# Altium footprint library North POLE.PcbLib: 419 footprints (part 23 of 27)
Each footprint in its own frame and in the unit in brackets; x right, y up, seen from the top. Pads: shape width x height; smd on the part's side, far side on the other; paste and mask are expansions set on the pad; w line width, h text height; cw(c..) or ccw(c..) is an arc to the next point about the centre after c.
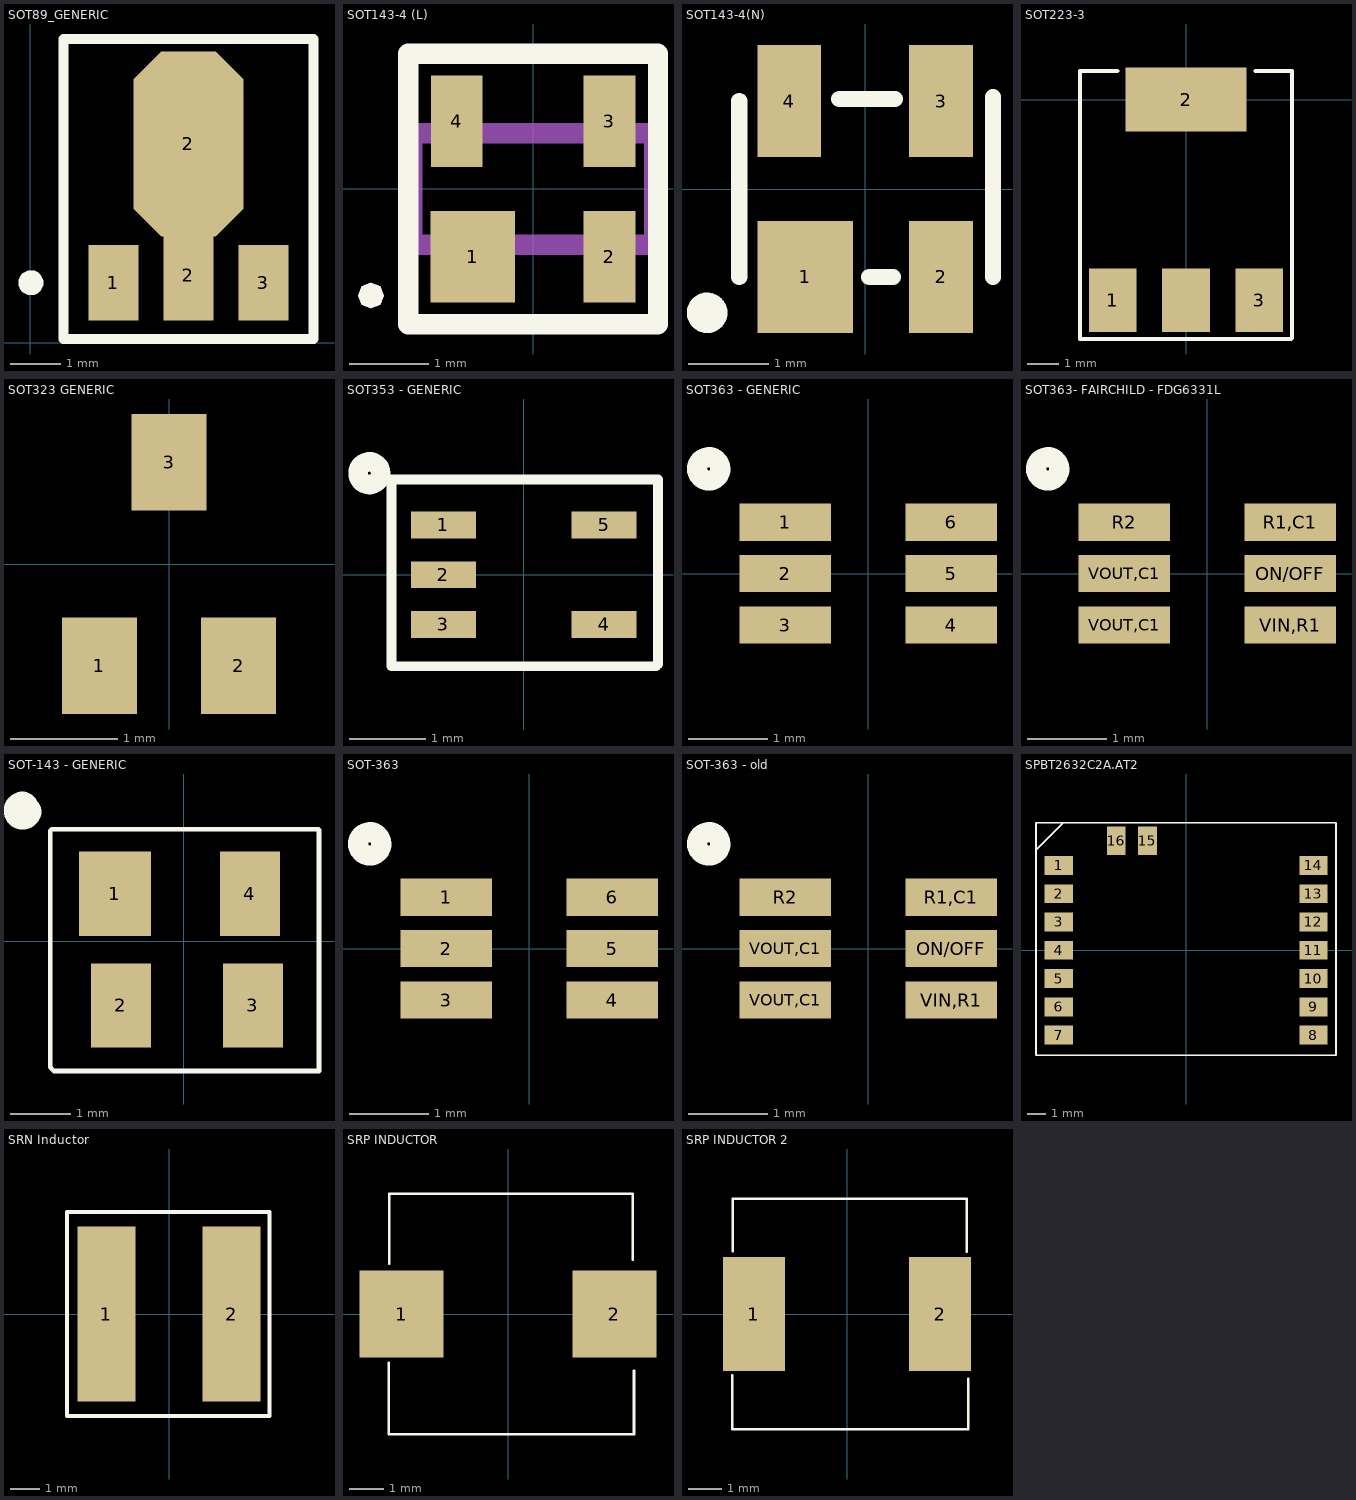
[diagram p22: the footprints below, top view; thin cyan lines are the x and y axes]

## SOT89_GENERIC [mm]
pads (4):
  rect 1x1.5 smd: 1(1.667,1.199) 3(4.667,1.199)
  oct 2.2x3.7 smd: 2(3.167,3.974)
  rect 1x1.8 smd: 2(3.167,1.349)
Top Overlay:
  circle w0.25: c0.017,1.199 r0.125
  lines w0.2: 0.667,0.074 5.667,0.074 5.667,6.074 0.667,6.074 0.667,0.074

## SOT143-4 (L) [mm]
pads (4):
  rect 1.06x1.15 smd paste-0.127 mask+0.125: 1(-0.76,-0.85)
  rect 0.65x1.15 smd paste-0.127 mask+0.125: 2(0.96,-0.85) 3(0.96,0.85) 4(-0.96,0.85)
Top Overlay:
  region: -2.04,-1.502 -2.155,-1.455 -2.202,-1.34 -2.155,-1.225 -2.04,-1.178 -1.925,-1.225 -1.878,-1.34 -1.925,-1.455
  lines w0.254: -1.57,-1.7 -1.57,1.7 1.57,1.7 1.57,-1.7 -1.57,-1.7
Mechanical 5:
  lines w0.127: -1.57,-1.7 -1.57,1.7 1.57,1.7 1.57,-1.7 -1.57,-1.7
Mechanical 6:
  region: -2.04,-1.502 -2.155,-1.455 -2.202,-1.34 -2.155,-1.225 -2.04,-1.178 -1.925,-1.225 -1.878,-1.34 -1.925,-1.455
  lines w0.254: -1.52,-0.7 1.52,-0.7 1.52,0.7 -1.52,0.7 -1.52,-0.7

## SOT143-4(N) [mm]
pads (4):
  rect 1.2x1.4 smd: 1(-0.75,-1.1)
  rect 0.8x1.4 smd: 2(0.95,-1.1) 3(0.95,1.1) 4(-0.95,1.1)
Top Overlay:
  circle w0.254: c-1.977,-1.55 r0.127
  lines w0.203: -1.575,-1.1 -1.575,1.1 ; -0.325,1.125 0.375,1.125 ; 0.05,-1.1 0.35,-1.1 ; 1.6,-1.1 1.6,1.15
3D body: height 1, standoff 0, extent -1.409,-1.185 1.511,1.235

## SOT223-3 [mm]
pads (4):
  rect 1.5x2 smd: 1(-2.3,-6.3) 3(2.3,-6.3) ""(0,-6.3)
  rect 3.8x2 smd: 2(0,0)
Top Overlay:
  lines w0.127: -2.159,0.889 -3.327,0.889 -3.327,-7.518 3.302,-7.518 3.327,-7.493 3.327,0.889 2.184,0.889
3D body: height 1.64, standoff -0.01, extent -3.25,-6.37 3.25,0.63

## SOT323 [mm]

## SOT323 GENERIC [mm]
pads (3):
  rect 0.7x0.9 smd: 1(-0.65,-0.95) 2(0.65,-0.95) 3(0,0.95)

## SOT353 - GENERIC [mm]
pads (5):
  rect 0.85x0.35 smd: 1(-1.05,0.65) 2(-1.05,0) 3(-1.05,-0.65) 4(1.05,-0.65) 5(1.05,0.65)
Top Overlay:
  lines w0.127: -1.727,-1.194 1.727,-1.194 1.753,-1.168 1.753,1.245 -1.727,1.245 -1.727,-1.194
  lines w0.254: -1.927,1.443 ccw(c-2.017,1.326) -1.905,1.422
3D body: height 1, standoff 0, extent -1.15,-1.05 1.15,1.05

## SOT363 - GENERIC [mm]
pads (6):
  rect 1.16x0.47 smd: 1(-1.05,0.65) 2(-1.05,0) 3(-1.05,-0.65) 4(1.05,-0.65) 5(1.05,0) 6(1.05,0.65)
Top Overlay:
  lines w0.254: -1.927,1.443 ccw(c-2.017,1.326) -1.905,1.422
3D body: height 1, standoff 0, extent -1.15,-1.05 1.15,1.05

## SOT363- FAIRCHILD - FDG6331L [mm]
pads (6):
  rect 1.16x0.47 smd: ON/OFF(1.05,0) R1,C1(1.05,0.65) R2(-1.05,0.65) VIN,R1(1.05,-0.65) VOUT,C1(-1.05,-0.65) VOUT,C1(-1.05,0)
Top Overlay:
  lines w0.254: -1.927,1.443 ccw(c-2.017,1.326) -1.905,1.422

## SOT-143 - GENERIC [mm]
pads (4):
  rect 1.2x1.4 smd: 1(-1.143,0.787)
  rect 1x1.4 smd: 2(-1.043,-1.067) 3(1.151,-1.067) 4(1.1,0.787)
Top Overlay:
  lines w0.076: -2.216,-2.095 -2.216,1.723 -2.216,1.837 -2.192,1.861 2.24,1.861 2.248,1.853 2.248,-2.155 -2.156,-2.155 -2.216,-2.095
  lines w0.508: -2.669,2.23 ccw(c-2.676,2.17) -2.619,2.153
3D body: height 1, standoff 0, extent -1.21,-1.46 1.21,1.46

## SOT-363 [mm]
pads (6):
  rect 1.16x0.47 smd: 1(-1.05,0.65) 2(-1.05,0) 3(-1.05,-0.65) 4(1.05,-0.65) 5(1.05,0) 6(1.05,0.65)
Top Overlay:
  lines w0.254: -1.927,1.443 ccw(c-2.017,1.326) -1.905,1.422

## SOT-363 - old [mm] "different pin names [BRH]"
pads (6):
  rect 1.16x0.47 smd: ON/OFF(1.05,0) R1,C1(1.05,0.65) R2(-1.05,0.65) VIN,R1(1.05,-0.65) VOUT,C1(-1.05,-0.65) VOUT,C1(-1.05,0)
Top Overlay:
  lines w0.254: -1.927,1.443 ccw(c-2.017,1.326) -1.905,1.422

## SPBT2632C2A.AT2 [mm]
pads (16):
  rect 1.5x1 smd mask+0.08: 1(-6.75,4.5) 2(-6.75,3) 3(-6.75,1.5) 4(-6.75,0) 5(-6.75,-1.5) 6(-6.75,-3) 7(-6.75,-4.5) 8(6.75,-4.5) 9(6.75,-3) 10(6.75,-1.5) 11(6.75,0) 12(6.75,1.5) 13(6.75,3) 14(6.75,4.5)
  rect 1x1.5 smd mask+0.08: 15(-2.05,5.8) 16(-3.7,5.8)
Top Overlay:
  lines w0.1: -7.958,5.354 -7.925,5.354 -6.561,6.718 -6.561,6.734 ; 7.927,6.759 -7.948,6.759 -7.948,-5.563 7.943,-5.563 ; 7.948,-5.563 7.948,6.759
3D body: height 4, standoff 0, extent -6.759,-4.5 6.767,5.801

## SRN Inductor [mm]
pads (2):
  rect 2x6 smd: 1(-2.15,0) 2(2.15,0)
Top Overlay:
  lines w0.127: -0.05,3.5 3.45,3.5 3.45,-3.5 -3.5,-3.5 -3.5,3.5 -0.025,3.5
3D body: height 4.5, standoff 0, extent -3,-3 3,3

## SRP INDUCTOR [mm]
pads (2):
  rect 2.4x2.5 smd mask+0.08: 1(-3.05,0) 2(3.05,0)
Top Overlay:
  lines w0.076: -3.423,-1.395 -3.423,-3.444 3.611,-3.444 3.611,-1.631 ; -3.409,1.44 -3.409,3.444 3.577,3.444 3.577,1.558
3D body: height 3.2, standoff 0, extent -3.258,-3.258 3.384,3.263

## SRP INDUCTOR 2 [mm]
pads (2):
  rect 1.85x3.4 smd mask+0.08: 1(-2.775,0) 2(2.775,0)
Top Overlay:
  lines w0.076: -3.423,-1.829 -3.423,-3.444 3.611,-3.444 3.611,-1.93 ; -3.409,1.88 -3.409,3.444 3.577,3.444 3.577,1.854
3D body: height 4, standoff 0, extent -3.258,-3.258 3.384,3.263